# Altium schematic symbol library jlcpcb_2025_04_resistors_extended_2512.schlib: 2667 symbols (part 9 of 14)
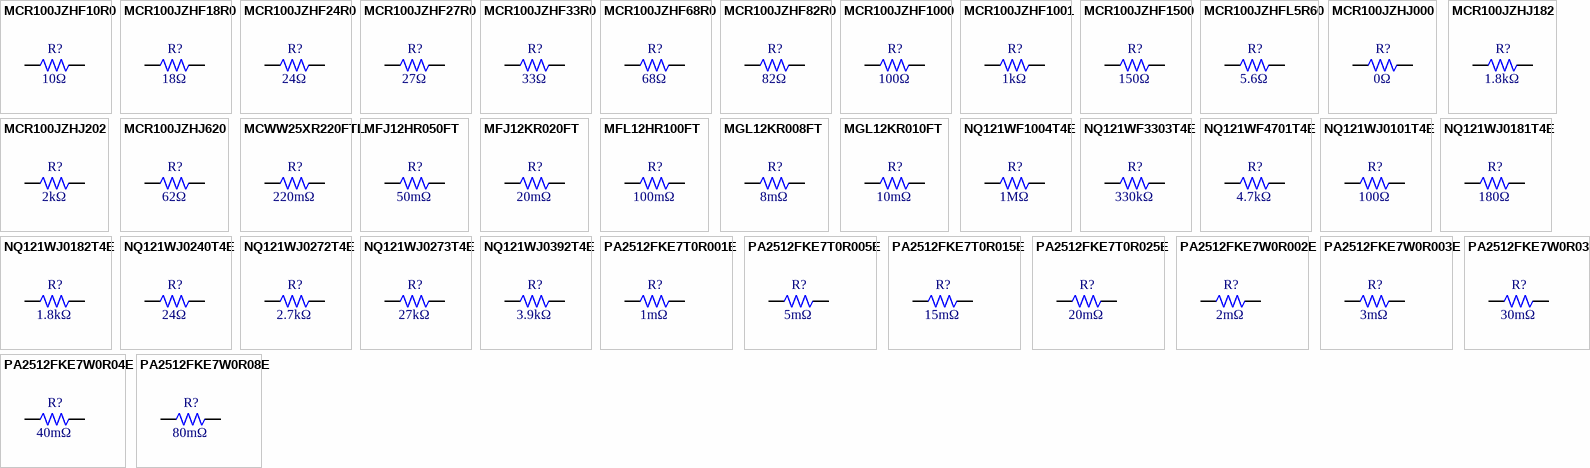
[diagram p74: symbols MCR100JZHF10R0 to PA2512FKE7W0R08E]

## NQ121WJ0240T4E
designator R?  Resistance: 24Ω  (hidden comment: *)
Resistor, 24Ω, ±5%, 1W, 200V, -55℃~+155℃, SMD 2512; Manufacturer: Uniroyal; Manufacturer Part Number: NQ121WJ0240T4E; Supplier 1: LCSC; Supplier Part Number 1: C2758612; JLCPCB Part Number: C2758612; Power Rating: 1W; Category: Resistors; Package Size: 2512; JLCPCB Basic Part: Yes; Tolerance: ±5%; Voltage Rating: 200V; Temperature Rating: -55℃~+155℃; ComponentLink1Description: Datasheet; ComponentLink1URL: https://wmsc.lcsc.com/wmsc/upload/file/pdf/v2/lcsc/2304140030_UNI-ROYAL-Uniroyal-Elec-NQ121WJ0240T4E_C2758612.pdf; ComponentLink2Description: JLCPCB Part URL; ComponentLink2URL: https://jlcpcb.com/partdetail/C2758612
pins: 1, 2
1 alternate drawing of the same symbol

## NQ121WJ0272T4E
designator R?  Resistance: 2.7kΩ  (hidden comment: *)
Resistor, 2.7kΩ, ±5%, 1W, 200V, -55℃~+155℃, SMD 2512; Manufacturer: Uniroyal; Manufacturer Part Number: NQ121WJ0272T4E; Supplier 1: LCSC; Supplier Part Number 1: C2758611; JLCPCB Part Number: C2758611; Power Rating: 1W; Category: Resistors; Package Size: 2512; JLCPCB Basic Part: Yes; Tolerance: ±5%; Voltage Rating: 200V; Temperature Rating: -55℃~+155℃; ComponentLink1Description: Datasheet; ComponentLink1URL: https://wmsc.lcsc.com/wmsc/upload/file/pdf/v2/lcsc/2304140030_UNI-ROYAL-Uniroyal-Elec-NQ121WJ0272T4E_C2758611.pdf; ComponentLink2Description: JLCPCB Part URL; ComponentLink2URL: https://jlcpcb.com/partdetail/C2758611
pins: 1, 2
1 alternate drawing of the same symbol

## NQ121WJ0273T4E
designator R?  Resistance: 27kΩ  (hidden comment: *)
Resistor, 27kΩ, ±5%, 1W, ±100ppm/℃, SMD 2512; Manufacturer: Uniroyal; Manufacturer Part Number: NQ121WJ0273T4E; Supplier 1: LCSC; Supplier Part Number 1: C964958; JLCPCB Part Number: C964958; Power Rating: 1W; Category: Resistors; Package Size: 2512; JLCPCB Basic Part: Yes; Tolerance: ±5%; Temperature Coefficient: ±100ppm/℃; ComponentLink1Description: Datasheet; ComponentLink1URL: https://wmsc.lcsc.com/wmsc/upload/file/pdf/v2/lcsc/2304140030_UNI-ROYAL-Uniroyal-Elec-NQ121WJ0273T4E_C964958.pdf; ComponentLink2Description: JLCPCB Part URL; ComponentLink2URL: https://jlcpcb.com/partdetail/C964958
pins: 1, 2
1 alternate drawing of the same symbol

## NQ121WJ0392T4E
designator R?  Resistance: 3.9kΩ  (hidden comment: *)
Resistor, 3.9kΩ, ±5%, 1W, ±100ppm/℃, SMD 2512; Manufacturer: Uniroyal; Manufacturer Part Number: NQ121WJ0392T4E; Supplier 1: LCSC; Supplier Part Number 1: C964957; JLCPCB Part Number: C964957; Power Rating: 1W; Category: Resistors; Package Size: 2512; JLCPCB Basic Part: Yes; Tolerance: ±5%; Temperature Coefficient: ±100ppm/℃; ComponentLink1Description: Datasheet; ComponentLink1URL: https://wmsc.lcsc.com/wmsc/upload/file/pdf/v2/lcsc/2304140030_UNI-ROYAL-Uniroyal-Elec-NQ121WJ0392T4E_C964957.pdf; ComponentLink2Description: JLCPCB Part URL; ComponentLink2URL: https://jlcpcb.com/partdetail/C964957
pins: 1, 2
1 alternate drawing of the same symbol

## PA2512FKE7T0R001E
designator R?  Resistance: 1mΩ  (hidden comment: *)
Resistor, 1mΩ, ±1%, 3W, ±50ppm/℃, -55℃~+170℃, SMD 2512; Manufacturer: Uniroyal; Manufacturer Part Number: PA2512FKE7T0R001E; Supplier 1: LCSC; Supplier Part Number 1: C728297; JLCPCB Part Number: C728297; Power Rating: 3W; Category: Resistors; Package Size: 2512; JLCPCB Basic Part: Yes; Tolerance: ±1%; Temperature Coefficient: ±50ppm/℃; Temperature Rating: -55℃~+170℃; ComponentLink1Description: Datasheet; ComponentLink1URL: https://wmsc.lcsc.com/wmsc/upload/file/pdf/v2/lcsc/2010221004_YAGEO-PA2512FKE7T0R001E_C728297.pdf; ComponentLink2Description: JLCPCB Part URL; ComponentLink2URL: https://jlcpcb.com/partdetail/C728297
pins: 1, 2
1 alternate drawing of the same symbol

## PA2512FKE7T0R005E
designator R?  Resistance: 5mΩ  (hidden comment: *)
Resistor, 5mΩ, ±1%, 3W, ±50ppm/℃, -55℃~+170℃, SMD 2512; Manufacturer: Uniroyal; Manufacturer Part Number: PA2512FKE7T0R005E; Supplier 1: LCSC; Supplier Part Number 1: C728298; JLCPCB Part Number: C728298; Power Rating: 3W; Category: Resistors; Package Size: 2512; JLCPCB Basic Part: Yes; Tolerance: ±1%; Temperature Coefficient: ±50ppm/℃; Temperature Rating: -55℃~+170℃; ComponentLink1Description: Datasheet; ComponentLink1URL: https://wmsc.lcsc.com/wmsc/upload/file/pdf/v2/lcsc/2301052030_YAGEO-PA2512FKE7T0R005E_C728298.pdf; ComponentLink2Description: JLCPCB Part URL; ComponentLink2URL: https://jlcpcb.com/partdetail/C728298
pins: 1, 2
1 alternate drawing of the same symbol

## PA2512FKE7T0R015E
designator R?  Resistance: 15mΩ  (hidden comment: *)
Resistor, 15mΩ, ±1%, 3W, ±50ppm/℃, -55℃~+170℃, SMD 2512; Manufacturer: Uniroyal; Manufacturer Part Number: PA2512FKE7T0R015E; Supplier 1: LCSC; Supplier Part Number 1: C728300; JLCPCB Part Number: C728300; Power Rating: 3W; Category: Resistors; Package Size: 2512; JLCPCB Basic Part: Yes; Tolerance: ±1%; Temperature Coefficient: ±50ppm/℃; Temperature Rating: -55℃~+170℃; ComponentLink1Description: Datasheet; ComponentLink1URL: https://wmsc.lcsc.com/wmsc/upload/file/pdf/v2/lcsc/2212062230_YAGEO-PA2512FKE7T0R015E_C728300.pdf; ComponentLink2Description: JLCPCB Part URL; ComponentLink2URL: https://jlcpcb.com/partdetail/C728300
pins: 1, 2
1 alternate drawing of the same symbol

## PA2512FKE7T0R025E
designator R?  Resistance: 20mΩ  (hidden comment: *)
Resistor, 20mΩ, ±1%, 3W, ±50ppm/℃, -55℃~+170℃, SMD 2512; Manufacturer: Uniroyal; Manufacturer Part Number: PA2512FKE7T0R025E; Supplier 1: LCSC; Supplier Part Number 1: C728301; JLCPCB Part Number: C728301; Power Rating: 3W; Category: Resistors; Package Size: 2512; JLCPCB Basic Part: Yes; Tolerance: ±1%; Temperature Coefficient: ±50ppm/℃; Temperature Rating: -55℃~+170℃; ComponentLink1Description: Datasheet; ComponentLink1URL: https://wmsc.lcsc.com/wmsc/upload/file/pdf/v2/lcsc/2010041434_YAGEO-PA2512FKE7T0R025E_C728301.pdf; ComponentLink2Description: JLCPCB Part URL; ComponentLink2URL: https://jlcpcb.com/partdetail/C728301
pins: 1, 2
1 alternate drawing of the same symbol

## PA2512FKE7W0R002E
designator R?  Resistance: 2mΩ  (hidden comment: *)
Resistor, 2mΩ, ±1%, 2W, ±50ppm/℃, -55℃~+170℃, SMD 2512; Manufacturer: Uniroyal; Manufacturer Part Number: PA2512FKE7W0R002E; Supplier 1: LCSC; Supplier Part Number 1: C728306; JLCPCB Part Number: C728306; Power Rating: 2W; Category: Resistors; Package Size: 2512; JLCPCB Basic Part: Yes; Tolerance: ±1%; Temperature Coefficient: ±50ppm/℃; Temperature Rating: -55℃~+170℃; ComponentLink1Description: Datasheet; ComponentLink1URL: https://wmsc.lcsc.com/wmsc/upload/file/pdf/v2/lcsc/2009261536_YAGEO-PA2512FKE7W0R002E_C728306.pdf; ComponentLink2Description: JLCPCB Part URL; ComponentLink2URL: https://jlcpcb.com/partdetail/C728306
pins: 1, 2
1 alternate drawing of the same symbol

## PA2512FKE7W0R003E
designator R?  Resistance: 3mΩ  (hidden comment: *)
Resistor, 3mΩ, ±1%, 2W, ±50ppm/℃, -55℃~+170℃, SMD 2512; Manufacturer: Uniroyal; Manufacturer Part Number: PA2512FKE7W0R003E; Supplier 1: LCSC; Supplier Part Number 1: C728307; JLCPCB Part Number: C728307; Power Rating: 2W; Category: Resistors; Package Size: 2512; JLCPCB Basic Part: Yes; Tolerance: ±1%; Temperature Coefficient: ±50ppm/℃; Temperature Rating: -55℃~+170℃; ComponentLink1Description: Datasheet; ComponentLink1URL: https://wmsc.lcsc.com/wmsc/upload/file/pdf/v2/lcsc/2011270939_YAGEO-PA2512FKE7W0R003E_C728307.pdf; ComponentLink2Description: JLCPCB Part URL; ComponentLink2URL: https://jlcpcb.com/partdetail/C728307
pins: 1, 2
1 alternate drawing of the same symbol

## PA2512FKE7W0R03E
designator R?  Resistance: 30mΩ  (hidden comment: *)
Resistor, 30mΩ, ±1%, 2W, ±50ppm/℃, -55℃~+170℃, SMD 2512; Manufacturer: Uniroyal; Manufacturer Part Number: PA2512FKE7W0R03E; Supplier 1: LCSC; Supplier Part Number 1: C728311; JLCPCB Part Number: C728311; Power Rating: 2W; Category: Resistors; Package Size: 2512; JLCPCB Basic Part: Yes; Tolerance: ±1%; Temperature Coefficient: ±50ppm/℃; Temperature Rating: -55℃~+170℃; ComponentLink1Description: Datasheet; ComponentLink1URL: https://wmsc.lcsc.com/wmsc/upload/file/pdf/v2/lcsc/2009191609_YAGEO-PA2512FKE7W0R03E_C728311.pdf; ComponentLink2Description: JLCPCB Part URL; ComponentLink2URL: https://jlcpcb.com/partdetail/C728311
pins: 1, 2
1 alternate drawing of the same symbol

## PA2512FKE7W0R04E
designator R?  Resistance: 40mΩ  (hidden comment: *)
Resistor, 40mΩ, ±1%, 2W, ±50ppm/℃, -55℃~+170℃, SMD 2512; Manufacturer: Uniroyal; Manufacturer Part Number: PA2512FKE7W0R04E; Supplier 1: LCSC; Supplier Part Number 1: C728312; JLCPCB Part Number: C728312; Power Rating: 2W; Category: Resistors; Package Size: 2512; JLCPCB Basic Part: Yes; Tolerance: ±1%; Temperature Coefficient: ±50ppm/℃; Temperature Rating: -55℃~+170℃; ComponentLink1Description: Datasheet; ComponentLink1URL: https://wmsc.lcsc.com/wmsc/upload/file/pdf/v2/lcsc/2011221205_YAGEO-PA2512FKE7W0R04E_C728312.pdf; ComponentLink2Description: JLCPCB Part URL; ComponentLink2URL: https://jlcpcb.com/partdetail/C728312
pins: 1, 2
1 alternate drawing of the same symbol

## PA2512FKE7W0R08E
designator R?  Resistance: 80mΩ  (hidden comment: *)
Resistor, 80mΩ, ±1%, 2W, ±100ppm/℃, -55℃~+170℃, SMD 2512; Manufacturer: Uniroyal; Manufacturer Part Number: PA2512FKE7W0R08E; Supplier 1: LCSC; Supplier Part Number 1: C728314; JLCPCB Part Number: C728314; Power Rating: 2W; Category: Resistors; Package Size: 2512; JLCPCB Basic Part: Yes; Tolerance: ±1%; Temperature Coefficient: ±100ppm/℃; Temperature Rating: -55℃~+170℃; ComponentLink1Description: Datasheet; ComponentLink1URL: https://wmsc.lcsc.com/wmsc/upload/file/pdf/v2/lcsc/2012011712_YAGEO-PA2512FKE7W0R08E_C728314.pdf; ComponentLink2Description: JLCPCB Part URL; ComponentLink2URL: https://jlcpcb.com/partdetail/C728314
pins: 1, 2
1 alternate drawing of the same symbol

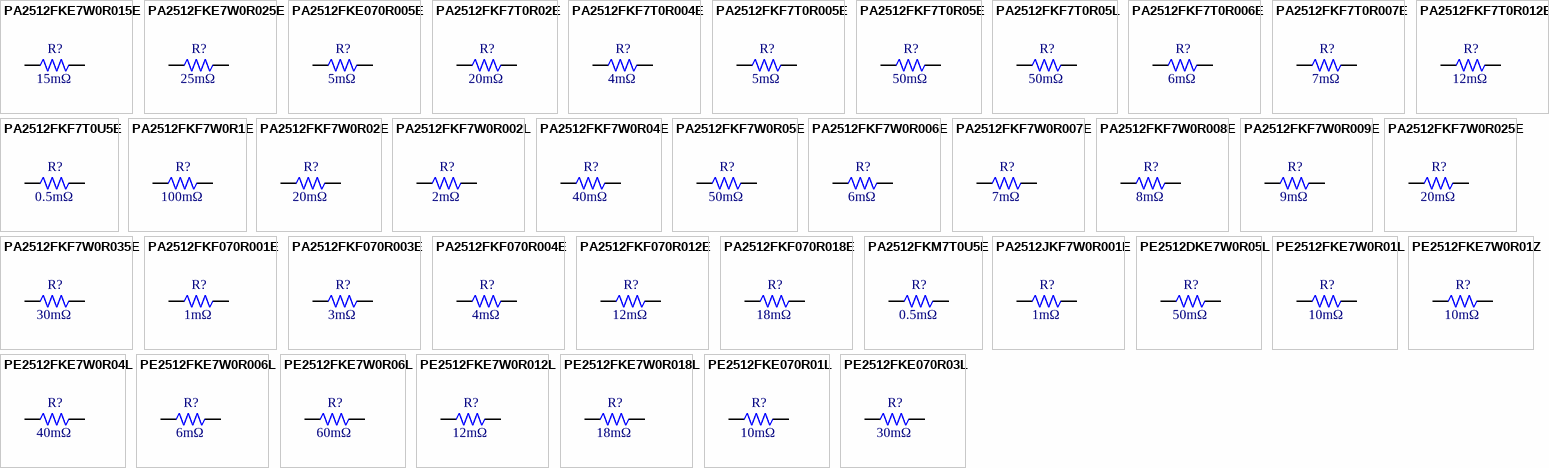
[diagram p40: symbols PA2512FKE7W0R015E to PE2512FKE070R03L]

## PA2512FKE7W0R015E
designator R?  Resistance: 15mΩ  (hidden comment: *)
Resistor, 15mΩ, ±1%, 2W, ±50ppm/℃, -55℃~+170℃, SMD 2512; Manufacturer: Uniroyal; Manufacturer Part Number: PA2512FKE7W0R015E; Supplier 1: LCSC; Supplier Part Number 1: C728308; JLCPCB Part Number: C728308; Power Rating: 2W; Category: Resistors; Package Size: 2512; JLCPCB Basic Part: Yes; Tolerance: ±1%; Temperature Coefficient: ±50ppm/℃; Temperature Rating: -55℃~+170℃; ComponentLink1Description: Datasheet; ComponentLink1URL: https://wmsc.lcsc.com/wmsc/upload/file/pdf/v2/lcsc/2008281035_YAGEO-PA2512FKE7W0R015E_C728308.pdf; ComponentLink2Description: JLCPCB Part URL; ComponentLink2URL: https://jlcpcb.com/partdetail/C728308
pins: 1, 2
1 alternate drawing of the same symbol

## PA2512FKE7W0R025E
designator R?  Resistance: 25mΩ  (hidden comment: *)
Resistor, 25mΩ, ±1%, 2W, ±50ppm/℃, -55℃~+170℃, SMD 2512; Manufacturer: Uniroyal; Manufacturer Part Number: PA2512FKE7W0R025E; Supplier 1: LCSC; Supplier Part Number 1: C728309; JLCPCB Part Number: C728309; Power Rating: 2W; Category: Resistors; Package Size: 2512; JLCPCB Basic Part: Yes; Tolerance: ±1%; Temperature Coefficient: ±50ppm/℃; Temperature Rating: -55℃~+170℃; ComponentLink1Description: Datasheet; ComponentLink1URL: https://wmsc.lcsc.com/wmsc/upload/file/pdf/v2/lcsc/2009191609_YAGEO-PA2512FKE7W0R025E_C728309.pdf; ComponentLink2Description: JLCPCB Part URL; ComponentLink2URL: https://jlcpcb.com/partdetail/C728309
pins: 1, 2
1 alternate drawing of the same symbol

## PA2512FKE070R005E
designator R?  Resistance: 5mΩ  (hidden comment: *)
Resistor, 5mΩ, ±1%, 1W, ±50ppm/℃, -55℃~+170℃, SMD 2512; Manufacturer: Uniroyal; Manufacturer Part Number: PA2512FKE070R005E; Supplier 1: LCSC; Supplier Part Number 1: C914837; JLCPCB Part Number: C914837; Power Rating: 1W; Category: Resistors; Package Size: 2512; JLCPCB Basic Part: Yes; Tolerance: ±1%; Temperature Coefficient: ±50ppm/℃; Temperature Rating: -55℃~+170℃; ComponentLink1Description: Datasheet; ComponentLink1URL: https://wmsc.lcsc.com/wmsc/upload/file/pdf/v2/lcsc/2011202108_YAGEO-PA2512FKE070R005E_C914837.pdf; ComponentLink2Description: JLCPCB Part URL; ComponentLink2URL: https://jlcpcb.com/partdetail/C914837
pins: 1, 2
1 alternate drawing of the same symbol

## PA2512FKF7T0R02E
designator R?  Resistance: 20mΩ  (hidden comment: *)
Resistor, 20mΩ, ±1%, 3W, ±100ppm/℃, SMD 2512; Manufacturer: Uniroyal; Manufacturer Part Number: PA2512FKF7T0R02E; Supplier 1: LCSC; Supplier Part Number 1: C728331; JLCPCB Part Number: C728331; Power Rating: 3W; Category: Resistors; Package Size: 2512; JLCPCB Basic Part: Yes; Tolerance: ±1%; Temperature Coefficient: ±100ppm/℃; ComponentLink1Description: Datasheet; ComponentLink1URL: https://wmsc.lcsc.com/wmsc/upload/file/pdf/v2/lcsc/2008281035_YAGEO-PA2512FKF7T0R02E_C728331.pdf; ComponentLink2Description: JLCPCB Part URL; ComponentLink2URL: https://jlcpcb.com/partdetail/C728331
pins: 1, 2
1 alternate drawing of the same symbol

## PA2512FKF7T0R004E
designator R?  Resistance: 4mΩ  (hidden comment: *)
Resistor, 4mΩ, ±1%, 3W, ±100ppm/℃, -55℃~+170℃, SMD 2512; Manufacturer: Uniroyal; Manufacturer Part Number: PA2512FKF7T0R004E; Supplier 1: LCSC; Supplier Part Number 1: C728322; JLCPCB Part Number: C728322; Power Rating: 3W; Category: Resistors; Package Size: 2512; JLCPCB Basic Part: Yes; Tolerance: ±1%; Temperature Coefficient: ±100ppm/℃; Temperature Rating: -55℃~+170℃; ComponentLink1Description: Datasheet; ComponentLink1URL: https://wmsc.lcsc.com/wmsc/upload/file/pdf/v2/lcsc/2009191609_YAGEO-PA2512FKF7T0R004E_C728322.pdf; ComponentLink2Description: JLCPCB Part URL; ComponentLink2URL: https://jlcpcb.com/partdetail/C728322
pins: 1, 2
1 alternate drawing of the same symbol

## PA2512FKF7T0R005E
designator R?  Resistance: 5mΩ  (hidden comment: *)
Resistor, 5mΩ, ±1%, 3W, ±100ppm/℃, -55℃~+170℃, SMD 2512; Manufacturer: Uniroyal; Manufacturer Part Number: PA2512FKF7T0R005E; Supplier 1: LCSC; Supplier Part Number 1: C728323; JLCPCB Part Number: C728323; Power Rating: 3W; Category: Resistors; Package Size: 2512; JLCPCB Basic Part: Yes; Tolerance: ±1%; Temperature Coefficient: ±100ppm/℃; Temperature Rating: -55℃~+170℃; ComponentLink1Description: Datasheet; ComponentLink1URL: https://wmsc.lcsc.com/wmsc/upload/file/pdf/v2/lcsc/2009261536_YAGEO-PA2512FKF7T0R005E_C728323.pdf; ComponentLink2Description: JLCPCB Part URL; ComponentLink2URL: https://jlcpcb.com/partdetail/C728323
pins: 1, 2
1 alternate drawing of the same symbol

## PA2512FKF7T0R05E
designator R?  Resistance: 50mΩ  (hidden comment: *)
Resistor, 50mΩ, ±1%, 3W, ±100ppm/℃, SMD 2512; Manufacturer: Uniroyal; Manufacturer Part Number: PA2512FKF7T0R05E; Supplier 1: LCSC; Supplier Part Number 1: C728334; JLCPCB Part Number: C728334; Power Rating: 3W; Category: Resistors; Package Size: 2512; JLCPCB Basic Part: Yes; Tolerance: ±1%; Temperature Coefficient: ±100ppm/℃; ComponentLink1Description: Datasheet; ComponentLink1URL: https://wmsc.lcsc.com/wmsc/upload/file/pdf/v2/lcsc/2008281035_YAGEO-PA2512FKF7T0R05E_C728334.pdf; ComponentLink2Description: JLCPCB Part URL; ComponentLink2URL: https://jlcpcb.com/partdetail/C728334
pins: 1, 2
1 alternate drawing of the same symbol

## PA2512FKF7T0R05L
designator R?  Resistance: 50mΩ  (hidden comment: *)
Resistor, 50mΩ, ±1%, 3W, ±100ppm/℃, SMD 2512; Manufacturer: Uniroyal; Manufacturer Part Number: PA2512FKF7T0R05L; Supplier 1: LCSC; Supplier Part Number 1: C728335; JLCPCB Part Number: C728335; Power Rating: 3W; Category: Resistors; Package Size: 2512; JLCPCB Basic Part: Yes; Tolerance: ±1%; Temperature Coefficient: ±100ppm/℃; ComponentLink1Description: Datasheet; ComponentLink1URL: https://wmsc.lcsc.com/wmsc/upload/file/pdf/v2/lcsc/2008281035_YAGEO-PA2512FKF7T0R05L_C728335.pdf; ComponentLink2Description: JLCPCB Part URL; ComponentLink2URL: https://jlcpcb.com/partdetail/C728335
pins: 1, 2
1 alternate drawing of the same symbol

## PA2512FKF7T0R006E
designator R?  Resistance: 6mΩ  (hidden comment: *)
Resistor, 6mΩ, ±1%, 3W, ±100ppm/℃, -55℃~+170℃, SMD 2512; Manufacturer: Uniroyal; Manufacturer Part Number: PA2512FKF7T0R006E; Supplier 1: LCSC; Supplier Part Number 1: C728325; JLCPCB Part Number: C728325; Power Rating: 3W; Category: Resistors; Package Size: 2512; JLCPCB Basic Part: Yes; Tolerance: ±1%; Temperature Coefficient: ±100ppm/℃; Temperature Rating: -55℃~+170℃; ComponentLink1Description: Datasheet; ComponentLink1URL: https://wmsc.lcsc.com/wmsc/upload/file/pdf/v2/lcsc/2010311304_YAGEO-PA2512FKF7T0R006E_C728325.pdf; ComponentLink2Description: JLCPCB Part URL; ComponentLink2URL: https://jlcpcb.com/partdetail/C728325
pins: 1, 2
1 alternate drawing of the same symbol

## PA2512FKF7T0R007E
designator R?  Resistance: 7mΩ  (hidden comment: *)
Resistor, 7mΩ, ±1%, 3W, ±100ppm/℃, -55℃~+170℃, SMD 2512; Manufacturer: Uniroyal; Manufacturer Part Number: PA2512FKF7T0R007E; Supplier 1: LCSC; Supplier Part Number 1: C728326; JLCPCB Part Number: C728326; Power Rating: 3W; Category: Resistors; Package Size: 2512; JLCPCB Basic Part: Yes; Tolerance: ±1%; Temperature Coefficient: ±100ppm/℃; Temperature Rating: -55℃~+170℃; ComponentLink1Description: Datasheet; ComponentLink1URL: https://wmsc.lcsc.com/wmsc/upload/file/pdf/v2/lcsc/2205121016_YAGEO-PA2512FKF7T0R007E_C728326.pdf; ComponentLink2Description: JLCPCB Part URL; ComponentLink2URL: https://jlcpcb.com/partdetail/C728326
pins: 1, 2
1 alternate drawing of the same symbol

## PA2512FKF7T0R012E
designator R?  Resistance: 12mΩ  (hidden comment: *)
Resistor, 12mΩ, ±1%, 3W, ±100ppm/℃, SMD 2512; Manufacturer: Uniroyal; Manufacturer Part Number: PA2512FKF7T0R012E; Supplier 1: LCSC; Supplier Part Number 1: C728329; JLCPCB Part Number: C728329; Power Rating: 3W; Category: Resistors; Package Size: 2512; JLCPCB Basic Part: Yes; Tolerance: ±1%; Temperature Coefficient: ±100ppm/℃; ComponentLink1Description: Datasheet; ComponentLink1URL: https://wmsc.lcsc.com/wmsc/upload/file/pdf/v2/lcsc/2010221004_YAGEO-PA2512FKF7T0R012E_C728329.pdf; ComponentLink2Description: JLCPCB Part URL; ComponentLink2URL: https://jlcpcb.com/partdetail/C728329
pins: 1, 2
1 alternate drawing of the same symbol

## PA2512FKF7T0U5E
designator R?  Resistance: 0.5mΩ  (hidden comment: *)
Resistor, 0.5mΩ, ±1%, 3W, ±100ppm/℃, -55℃~+170℃, SMD 2512; Manufacturer: Uniroyal; Manufacturer Part Number: PA2512FKF7T0U5E; Supplier 1: LCSC; Supplier Part Number 1: C728336; JLCPCB Part Number: C728336; Power Rating: 3W; Category: Resistors; Package Size: 2512; JLCPCB Basic Part: Yes; Tolerance: ±1%; Temperature Coefficient: ±100ppm/℃; Temperature Rating: -55℃~+170℃; ComponentLink1Description: Datasheet; ComponentLink1URL: https://wmsc.lcsc.com/wmsc/upload/file/pdf/v2/lcsc/2009261536_YAGEO-PA2512FKF7T0U5E_C728336.pdf; ComponentLink2Description: JLCPCB Part URL; ComponentLink2URL: https://jlcpcb.com/partdetail/C728336
pins: 1, 2
1 alternate drawing of the same symbol

## PA2512FKF7W0R1E
designator R?  Resistance: 100mΩ  (hidden comment: *)
Resistor, 100mΩ, ±1%, 2W, ±100ppm/℃, -55℃~+170℃, SMD 2512; Manufacturer: Uniroyal; Manufacturer Part Number: PA2512FKF7W0R1E; Supplier 1: LCSC; Supplier Part Number 1: C728355; JLCPCB Part Number: C728355; Power Rating: 2W; Category: Resistors; Package Size: 2512; JLCPCB Basic Part: Yes; Tolerance: ±1%; Temperature Coefficient: ±100ppm/℃; Temperature Rating: -55℃~+170℃; ComponentLink1Description: Datasheet; ComponentLink1URL: https://wmsc.lcsc.com/wmsc/upload/file/pdf/v2/lcsc/2011270939_YAGEO-PA2512FKF7W0R1E_C728355.pdf; ComponentLink2Description: JLCPCB Part URL; ComponentLink2URL: https://jlcpcb.com/partdetail/C728355
pins: 1, 2
1 alternate drawing of the same symbol

## PA2512FKF7W0R02E
designator R?  Resistance: 20mΩ  (hidden comment: *)
Resistor, 20mΩ, ±1%, 2W, ±100ppm/℃, -55℃~+170℃, SMD 2512; Manufacturer: Uniroyal; Manufacturer Part Number: PA2512FKF7W0R02E; Supplier 1: LCSC; Supplier Part Number 1: C728347; JLCPCB Part Number: C728347; Power Rating: 2W; Category: Resistors; Package Size: 2512; JLCPCB Basic Part: Yes; Tolerance: ±1%; Temperature Coefficient: ±100ppm/℃; Temperature Rating: -55℃~+170℃; ComponentLink1Description: Datasheet; ComponentLink1URL: https://wmsc.lcsc.com/wmsc/upload/file/pdf/v2/lcsc/2009191609_YAGEO-PA2512FKF7W0R02E_C728347.pdf; ComponentLink2Description: JLCPCB Part URL; ComponentLink2URL: https://jlcpcb.com/partdetail/C728347
pins: 1, 2
1 alternate drawing of the same symbol

## PA2512FKF7W0R002L
designator R?  Resistance: 2mΩ  (hidden comment: *)
Resistor, 2mΩ, ±1%, 2W, ±100ppm/℃, -55℃~+170℃, SMD 2512; Manufacturer: Uniroyal; Manufacturer Part Number: PA2512FKF7W0R002L; Supplier 1: LCSC; Supplier Part Number 1: C728337; JLCPCB Part Number: C728337; Power Rating: 2W; Category: Resistors; Package Size: 2512; JLCPCB Basic Part: Yes; Tolerance: ±1%; Temperature Coefficient: ±100ppm/℃; Temperature Rating: -55℃~+170℃; ComponentLink1Description: Datasheet; ComponentLink1URL: https://wmsc.lcsc.com/wmsc/upload/file/pdf/v2/lcsc/2212292030_YAGEO-PA2512FKF7W0R002L_C728337.pdf; ComponentLink2Description: JLCPCB Part URL; ComponentLink2URL: https://jlcpcb.com/partdetail/C728337
pins: 1, 2
1 alternate drawing of the same symbol

## PA2512FKF7W0R04E
designator R?  Resistance: 40mΩ  (hidden comment: *)
Resistor, 40mΩ, ±1%, 2W, ±100ppm/℃, -55℃~+170℃, SMD 2512; Manufacturer: Uniroyal; Manufacturer Part Number: PA2512FKF7W0R04E; Supplier 1: LCSC; Supplier Part Number 1: C728351; JLCPCB Part Number: C728351; Power Rating: 2W; Category: Resistors; Package Size: 2512; JLCPCB Basic Part: Yes; Tolerance: ±1%; Temperature Coefficient: ±100ppm/℃; Temperature Rating: -55℃~+170℃; ComponentLink1Description: Datasheet; ComponentLink1URL: https://wmsc.lcsc.com/wmsc/upload/file/pdf/v2/lcsc/2011201408_YAGEO-PA2512FKF7W0R04E_C728351.pdf; ComponentLink2Description: JLCPCB Part URL; ComponentLink2URL: https://jlcpcb.com/partdetail/C728351
pins: 1, 2
1 alternate drawing of the same symbol

## PA2512FKF7W0R05E
designator R?  Resistance: 50mΩ  (hidden comment: *)
Resistor, 50mΩ, ±1%, 2W, ±100ppm/℃, -55℃~+170℃, SMD 2512; Manufacturer: Uniroyal; Manufacturer Part Number: PA2512FKF7W0R05E; Supplier 1: LCSC; Supplier Part Number 1: C728352; JLCPCB Part Number: C728352; Power Rating: 2W; Category: Resistors; Package Size: 2512; JLCPCB Basic Part: Yes; Tolerance: ±1%; Temperature Coefficient: ±100ppm/℃; Temperature Rating: -55℃~+170℃; ComponentLink1Description: Datasheet; ComponentLink1URL: https://wmsc.lcsc.com/wmsc/upload/file/pdf/v2/lcsc/2009191609_YAGEO-PA2512FKF7W0R05E_C728352.pdf; ComponentLink2Description: JLCPCB Part URL; ComponentLink2URL: https://jlcpcb.com/partdetail/C728352
pins: 1, 2
1 alternate drawing of the same symbol

## PA2512FKF7W0R006E
designator R?  Resistance: 6mΩ  (hidden comment: *)
Resistor, 6mΩ, ±1%, 2W, ±100ppm/℃, -55℃~+170℃, SMD 2512; Manufacturer: Uniroyal; Manufacturer Part Number: PA2512FKF7W0R006E; Supplier 1: LCSC; Supplier Part Number 1: C728340; JLCPCB Part Number: C728340; Power Rating: 2W; Category: Resistors; Package Size: 2512; JLCPCB Basic Part: Yes; Tolerance: ±1%; Temperature Coefficient: ±100ppm/℃; Temperature Rating: -55℃~+170℃; ComponentLink1Description: Datasheet; ComponentLink1URL: https://wmsc.lcsc.com/wmsc/upload/file/pdf/v2/lcsc/2010041434_YAGEO-PA2512FKF7W0R006E_C728340.pdf; ComponentLink2Description: JLCPCB Part URL; ComponentLink2URL: https://jlcpcb.com/partdetail/C728340
pins: 1, 2
1 alternate drawing of the same symbol

## PA2512FKF7W0R007E
designator R?  Resistance: 7mΩ  (hidden comment: *)
Resistor, 7mΩ, ±1%, 2W, ±100ppm/℃, -55℃~+170℃, SMD 2512; Manufacturer: Uniroyal; Manufacturer Part Number: PA2512FKF7W0R007E; Supplier 1: LCSC; Supplier Part Number 1: C728341; JLCPCB Part Number: C728341; Power Rating: 2W; Category: Resistors; Package Size: 2512; JLCPCB Basic Part: Yes; Tolerance: ±1%; Temperature Coefficient: ±100ppm/℃; Temperature Rating: -55℃~+170℃; ComponentLink1Description: Datasheet; ComponentLink1URL: https://wmsc.lcsc.com/wmsc/upload/file/pdf/v2/lcsc/2009191609_YAGEO-PA2512FKF7W0R007E_C728341.pdf; ComponentLink2Description: JLCPCB Part URL; ComponentLink2URL: https://jlcpcb.com/partdetail/C728341
pins: 1, 2
1 alternate drawing of the same symbol

## PA2512FKF7W0R008E
designator R?  Resistance: 8mΩ  (hidden comment: *)
Resistor, 8mΩ, ±1%, 2W, ±100ppm/℃, -55℃~+170℃, SMD 2512; Manufacturer: Uniroyal; Manufacturer Part Number: PA2512FKF7W0R008E; Supplier 1: LCSC; Supplier Part Number 1: C728343; JLCPCB Part Number: C728343; Power Rating: 2W; Category: Resistors; Package Size: 2512; JLCPCB Basic Part: Yes; Tolerance: ±1%; Temperature Coefficient: ±100ppm/℃; Temperature Rating: -55℃~+170℃; ComponentLink1Description: Datasheet; ComponentLink1URL: https://wmsc.lcsc.com/wmsc/upload/file/pdf/v2/lcsc/2009191609_YAGEO-PA2512FKF7W0R008E_C728343.pdf; ComponentLink2Description: JLCPCB Part URL; ComponentLink2URL: https://jlcpcb.com/partdetail/C728343
pins: 1, 2
1 alternate drawing of the same symbol

## PA2512FKF7W0R009E
designator R?  Resistance: 9mΩ  (hidden comment: *)
Resistor, 9mΩ, ±1%, 2W, ±100ppm/℃, -55℃~+170℃, SMD 2512; Manufacturer: Uniroyal; Manufacturer Part Number: PA2512FKF7W0R009E; Supplier 1: LCSC; Supplier Part Number 1: C728344; JLCPCB Part Number: C728344; Power Rating: 2W; Category: Resistors; Package Size: 2512; JLCPCB Basic Part: Yes; Tolerance: ±1%; Temperature Coefficient: ±100ppm/℃; Temperature Rating: -55℃~+170℃; ComponentLink1Description: Datasheet; ComponentLink1URL: https://wmsc.lcsc.com/wmsc/upload/file/pdf/v2/lcsc/2011221205_YAGEO-PA2512FKF7W0R009E_C728344.pdf; ComponentLink2Description: JLCPCB Part URL; ComponentLink2URL: https://jlcpcb.com/partdetail/C728344
pins: 1, 2
1 alternate drawing of the same symbol

## PA2512FKF7W0R025E
designator R?  Resistance: 20mΩ  (hidden comment: *)
Resistor, 20mΩ, ±1%, 2W, ±100ppm/℃, -55℃~+170℃, SMD 2512; Manufacturer: Uniroyal; Manufacturer Part Number: PA2512FKF7W0R025E; Supplier 1: LCSC; Supplier Part Number 1: C728346; JLCPCB Part Number: C728346; Power Rating: 2W; Category: Resistors; Package Size: 2512; JLCPCB Basic Part: Yes; Tolerance: ±1%; Temperature Coefficient: ±100ppm/℃; Temperature Rating: -55℃~+170℃; ComponentLink1Description: Datasheet; ComponentLink1URL: https://wmsc.lcsc.com/wmsc/upload/file/pdf/v2/lcsc/2011201408_YAGEO-PA2512FKF7W0R025E_C728346.pdf; ComponentLink2Description: JLCPCB Part URL; ComponentLink2URL: https://jlcpcb.com/partdetail/C728346
pins: 1, 2
1 alternate drawing of the same symbol

## PA2512FKF7W0R035E
designator R?  Resistance: 30mΩ  (hidden comment: *)
Resistor, 30mΩ, ±1%, 2W, ±100ppm/℃, -55℃~+170℃, SMD 2512; Manufacturer: Uniroyal; Manufacturer Part Number: PA2512FKF7W0R035E; Supplier 1: LCSC; Supplier Part Number 1: C728349; JLCPCB Part Number: C728349; Power Rating: 2W; Category: Resistors; Package Size: 2512; JLCPCB Basic Part: Yes; Tolerance: ±1%; Temperature Coefficient: ±100ppm/℃; Temperature Rating: -55℃~+170℃; ComponentLink1Description: Datasheet; ComponentLink1URL: https://wmsc.lcsc.com/wmsc/upload/file/pdf/v2/lcsc/2010041434_YAGEO-PA2512FKF7W0R035E_C728349.pdf; ComponentLink2Description: JLCPCB Part URL; ComponentLink2URL: https://jlcpcb.com/partdetail/C728349
pins: 1, 2
1 alternate drawing of the same symbol

## PA2512FKF070R001E
designator R?  Resistance: 1mΩ  (hidden comment: *)
Resistor, 1mΩ, ±1%, 1W, ±100ppm/℃, -55℃~+170℃, SMD 2512; Manufacturer: Uniroyal; Manufacturer Part Number: PA2512FKF070R001E; Supplier 1: LCSC; Supplier Part Number 1: C875586; JLCPCB Part Number: C875586; Power Rating: 1W; Category: Resistors; Package Size: 2512; JLCPCB Basic Part: Yes; Tolerance: ±1%; Temperature Coefficient: ±100ppm/℃; Temperature Rating: -55℃~+170℃; ComponentLink1Description: Datasheet; ComponentLink1URL: https://wmsc.lcsc.com/wmsc/upload/file/pdf/v2/lcsc/2210201630_YAGEO-PA2512FKF070R001E_C875586.pdf; ComponentLink2Description: JLCPCB Part URL; ComponentLink2URL: https://jlcpcb.com/partdetail/C875586
pins: 1, 2
1 alternate drawing of the same symbol

## PA2512FKF070R003E
designator R?  Resistance: 3mΩ  (hidden comment: *)
Resistor, 3mΩ, ±1%, 1W, ±100ppm/℃, -55℃~+170℃, SMD 2512; Manufacturer: Uniroyal; Manufacturer Part Number: PA2512FKF070R003E; Supplier 1: LCSC; Supplier Part Number 1: C875587; JLCPCB Part Number: C875587; Power Rating: 1W; Category: Resistors; Package Size: 2512; JLCPCB Basic Part: Yes; Tolerance: ±1%; Temperature Coefficient: ±100ppm/℃; Temperature Rating: -55℃~+170℃; ComponentLink1Description: Datasheet; ComponentLink1URL: https://wmsc.lcsc.com/wmsc/upload/file/pdf/v2/lcsc/2210201630_YAGEO-PA2512FKF070R003E_C875587.pdf; ComponentLink2Description: JLCPCB Part URL; ComponentLink2URL: https://jlcpcb.com/partdetail/C875587
pins: 1, 2
1 alternate drawing of the same symbol

## PA2512FKF070R004E
designator R?  Resistance: 4mΩ  (hidden comment: *)
Resistor, 4mΩ, ±1%, 1W, ±100ppm/℃, -55℃~+170℃, SMD 2512; Manufacturer: Uniroyal; Manufacturer Part Number: PA2512FKF070R004E; Supplier 1: LCSC; Supplier Part Number 1: C728316; JLCPCB Part Number: C728316; Power Rating: 1W; Category: Resistors; Package Size: 2512; JLCPCB Basic Part: Yes; Tolerance: ±1%; Temperature Coefficient: ±100ppm/℃; Temperature Rating: -55℃~+170℃; ComponentLink1Description: Datasheet; ComponentLink1URL: https://wmsc.lcsc.com/wmsc/upload/file/pdf/v2/lcsc/2010221004_YAGEO-PA2512FKF070R004E_C728316.pdf; ComponentLink2Description: JLCPCB Part URL; ComponentLink2URL: https://jlcpcb.com/partdetail/C728316
pins: 1, 2
1 alternate drawing of the same symbol

## PA2512FKF070R012E
designator R?  Resistance: 12mΩ  (hidden comment: *)
Resistor, 12mΩ, ±1%, 1W, ±100ppm/℃, -55℃~+170℃, SMD 2512; Manufacturer: Uniroyal; Manufacturer Part Number: PA2512FKF070R012E; Supplier 1: LCSC; Supplier Part Number 1: C914838; JLCPCB Part Number: C914838; Power Rating: 1W; Category: Resistors; Package Size: 2512; JLCPCB Basic Part: Yes; Tolerance: ±1%; Temperature Coefficient: ±100ppm/℃; Temperature Rating: -55℃~+170℃; ComponentLink1Description: Datasheet; ComponentLink1URL: https://wmsc.lcsc.com/wmsc/upload/file/pdf/v2/lcsc/2011202108_YAGEO-PA2512FKF070R012E_C914838.pdf; ComponentLink2Description: JLCPCB Part URL; ComponentLink2URL: https://jlcpcb.com/partdetail/C914838
pins: 1, 2
1 alternate drawing of the same symbol

## PA2512FKF070R018E
designator R?  Resistance: 18mΩ  (hidden comment: *)
Resistor, 18mΩ, ±1%, 1W, ±100ppm/℃, -55℃~+170℃, SMD 2512; Manufacturer: Uniroyal; Manufacturer Part Number: PA2512FKF070R018E; Supplier 1: LCSC; Supplier Part Number 1: C914839; JLCPCB Part Number: C914839; Power Rating: 1W; Category: Resistors; Package Size: 2512; JLCPCB Basic Part: Yes; Tolerance: ±1%; Temperature Coefficient: ±100ppm/℃; Temperature Rating: -55℃~+170℃; ComponentLink1Description: Datasheet; ComponentLink1URL: https://wmsc.lcsc.com/wmsc/upload/file/pdf/v2/lcsc/2011202108_YAGEO-PA2512FKF070R018E_C914839.pdf; ComponentLink2Description: JLCPCB Part URL; ComponentLink2URL: https://jlcpcb.com/partdetail/C914839
pins: 1, 2
1 alternate drawing of the same symbol

## PA2512FKM7T0U5E
designator R?  Resistance: 0.5mΩ  (hidden comment: *)
Resistor, 0.5mΩ, ±1%, 3W, ±75ppm/℃, -55℃~+170℃, SMD 2512; Manufacturer: Uniroyal; Manufacturer Part Number: PA2512FKM7T0U5E; Supplier 1: LCSC; Supplier Part Number 1: C3033267; JLCPCB Part Number: C3033267; Power Rating: 3W; Category: Resistors; Package Size: 2512; JLCPCB Basic Part: Yes; Tolerance: ±1%; Temperature Coefficient: ±75ppm/℃; Temperature Rating: -55℃~+170℃; ComponentLink1Description: Datasheet; ComponentLink1URL: https://wmsc.lcsc.com/wmsc/upload/file/pdf/v2/lcsc/2206171715_YAGEO-PA2512FKM7T0U5E_C3033267.pdf; ComponentLink2Description: JLCPCB Part URL; ComponentLink2URL: https://jlcpcb.com/partdetail/C3033267
pins: 1, 2
1 alternate drawing of the same symbol

## PA2512JKF7W0R001E
designator R?  Resistance: 1mΩ  (hidden comment: *)
Resistor, 1mΩ, ±5%, 2W, ±100ppm/℃, -55℃~+170℃, SMD 2512; Manufacturer: Uniroyal; Manufacturer Part Number: PA2512JKF7W0R001E; Supplier 1: LCSC; Supplier Part Number 1: C728356; JLCPCB Part Number: C728356; Power Rating: 2W; Category: Resistors; Package Size: 2512; JLCPCB Basic Part: Yes; Tolerance: ±5%; Temperature Coefficient: ±100ppm/℃; Temperature Rating: -55℃~+170℃; ComponentLink1Description: Datasheet; ComponentLink1URL: https://wmsc.lcsc.com/wmsc/upload/file/pdf/v2/lcsc/2011091913_YAGEO-PA2512JKF7W0R001E_C728356.pdf; ComponentLink2Description: JLCPCB Part URL; ComponentLink2URL: https://jlcpcb.com/partdetail/C728356
pins: 1, 2
1 alternate drawing of the same symbol

## PE2512DKE7W0R05L
designator R?  Resistance: 50mΩ  (hidden comment: *)
Resistor, 50mΩ, ±0.5%, 2W, ±50ppm/℃, -55℃~+170℃, SMD 2512; Manufacturer: Uniroyal; Manufacturer Part Number: PE2512DKE7W0R05L; Supplier 1: LCSC; Supplier Part Number 1: C4181606; JLCPCB Part Number: C4181606; Power Rating: 2W; Category: Resistors; Package Size: 2512; JLCPCB Basic Part: Yes; Tolerance: ±0.5%; Temperature Coefficient: ±50ppm/℃; Temperature Rating: -55℃~+170℃; ComponentLink1Description: Datasheet; ComponentLink1URL: https://wmsc.lcsc.com/wmsc/upload/file/pdf/v2/lcsc/2311211101_YAGEO-PE2512DKE7W0R05L_C4181606.pdf; ComponentLink2Description: JLCPCB Part URL; ComponentLink2URL: https://jlcpcb.com/partdetail/C4181606
pins: 1, 2
1 alternate drawing of the same symbol

## PE2512FKE7W0R01L
designator R?  Resistance: 10mΩ  (hidden comment: *)
Resistor, 10mΩ, ±1%, 2W, ±50ppm/℃, -55℃~+170℃, SMD 2512; Manufacturer: Uniroyal; Manufacturer Part Number: PE2512FKE7W0R01L; Supplier 1: LCSC; Supplier Part Number 1: C875720; JLCPCB Part Number: C875720; Power Rating: 2W; Category: Resistors; Package Size: 2512; JLCPCB Basic Part: Yes; Tolerance: ±1%; Temperature Coefficient: ±50ppm/℃; Temperature Rating: -55℃~+170℃; ComponentLink1Description: Datasheet; ComponentLink1URL: https://wmsc.lcsc.com/wmsc/upload/file/pdf/v2/lcsc/2203031730_YAGEO-PE2512FKE7W0R01L_C875720.pdf; ComponentLink2Description: JLCPCB Part URL; ComponentLink2URL: https://jlcpcb.com/partdetail/C875720
pins: 1, 2
1 alternate drawing of the same symbol

## PE2512FKE7W0R01Z
designator R?  Resistance: 10mΩ  (hidden comment: *)
Resistor, 10mΩ, ±1%, 2W, ±50ppm/℃, SMD 2512; Manufacturer: Uniroyal; Manufacturer Part Number: PE2512FKE7W0R01Z; Supplier 1: LCSC; Supplier Part Number 1: C875721; JLCPCB Part Number: C875721; Power Rating: 2W; Category: Resistors; Package Size: 2512; JLCPCB Basic Part: Yes; Tolerance: ±1%; Temperature Coefficient: ±50ppm/℃; ComponentLink1Description: Datasheet; ComponentLink1URL: https://wmsc.lcsc.com/wmsc/upload/file/pdf/v2/lcsc/2110200930_YAGEO-PE2512FKE7W0R01Z_C875721.pdf; ComponentLink2Description: JLCPCB Part URL; ComponentLink2URL: https://jlcpcb.com/partdetail/C875721
pins: 1, 2
1 alternate drawing of the same symbol
